# Altium integrated library ATK-DLAM62LB V1.0.IntLib: 194 symbols (continued)
## KEY_3
designator USER?, comment USER
按键; BOM名称: 3x6轻触开关; 版权归属: 正点原子; 学习资源: www.openedv.com
footprint TSW DIP-6*6*5 (6*6*5mm)
footprint TSW SMD-2S
footprint TSW SMD-3*6*2.5 (3*6*2.5mm)
footprint TSW SMD-3*6*4.3 (3*6*4.3mm)
footprint TSW SMD-3*6*5 (3*6*5mm)
footprint KEY_SOP324225 (KEY,3.2mm*4.2mm*2.5mm)
pins: 1, 2

## KF2EDGR-3.81-8P
designator J?
接线端子,8脚,间距3.81mm
footprint KF2EDGR_3.81_8P
pins: 1, 2, 3, 4, 5, 6, 7, 8

## L
designator L?, comment 4.7uH
小功率贴片电感磁珠; 版权归属: 源创客; BOM名称: 小功率贴片电感; 学习资源: www.ooocke.com
footprint L 0402 (小功率贴片电感)
footprint L 0603 (小功率贴片电感)
footprint L 0805 (小功率贴片电感)
footprint L 1206 (小功率贴片电感)
footprint L 1210 (小功率贴片电感)
footprint L 1806 (小功率贴片电感)
footprint L 1812 (小功率贴片电感)
footprint L 1008 (2.5mm*2.0mm*1.2mm(长*宽*高）)
footprint L_2520
pins: 1, 2

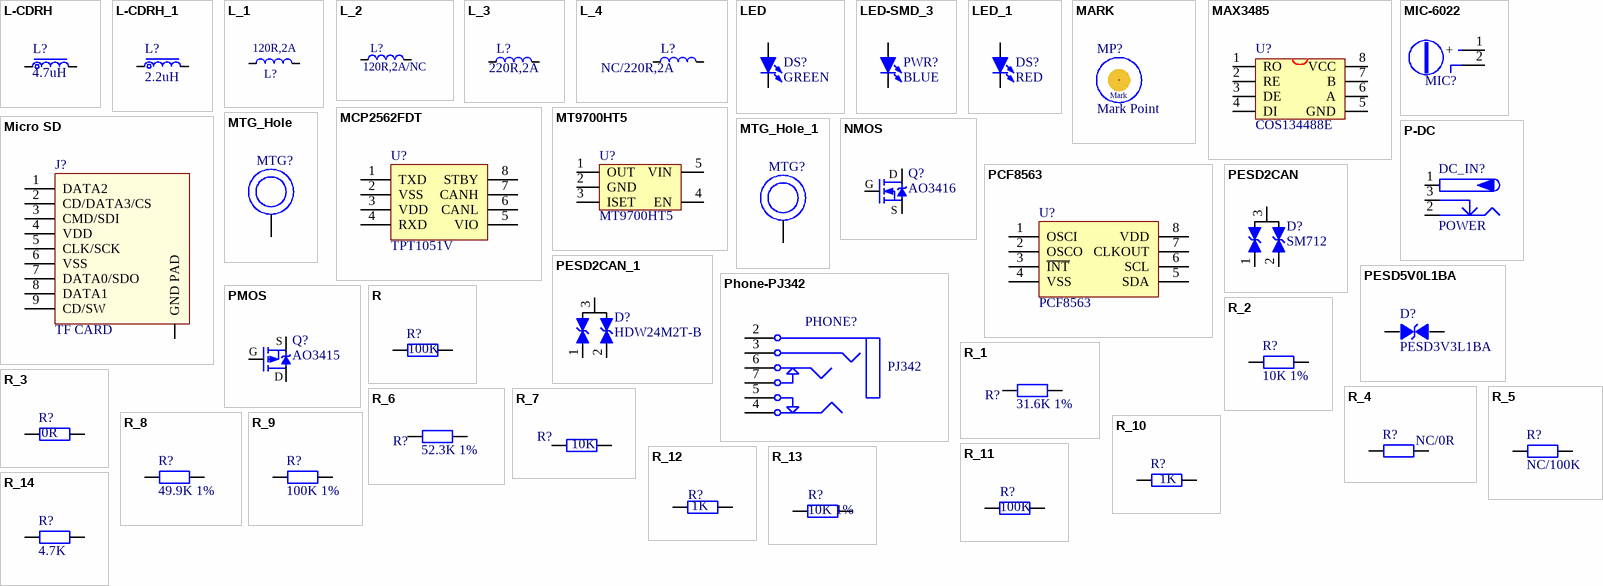
[diagram p2: symbols L-CDRH to R_14]

## L-CDRH
designator L?, comment 4.7uH
功率屏蔽电感; 版权归属: 正点原子; Parameter: 电感/磁珠; BOM名称: 功率屏蔽电感; 学习资源: www.openedv.com
footprint CDRH73 (7.3*7.3*3.4mm（长宽高）)
footprint CDRH74 (7.3*7.3*4.5mm（长宽高）)
footprint CDRH124 (12*12*4.5mm（长宽高）)
footprint CDRH125 (12*12*5mm（长宽高）)
footprint CDRH127 (12*12*8mm（长宽高）)
footprint CDRH129 (12*12*9.5mm（长宽高）)
footprint L-SMD-0420 (一体化成型电感 4*4.5*2mm（长宽高）)
footprint L-SMD-0630 (一体化成型电感)
footprint L-2520 (贴片电感-2520)
pins: 1, 2

## L-CDRH_1
designator L?, comment 2.2uH
功率屏蔽电感; 版权归属: 正点原子; Parameter: 电感/磁珠; BOM名称: 功率屏蔽电感; 学习资源: www.openedv.com
footprint CDRH73 (7.3*7.3*3.4mm（长宽高）)
footprint CDRH74 (7.3*7.3*4.5mm（长宽高）)
footprint CDRH124 (12*12*4.5mm（长宽高）)
footprint CDRH125 (12*12*5mm（长宽高）)
footprint CDRH127 (12*12*8mm（长宽高）)
footprint CDRH129 (12*12*9.5mm（长宽高）)
footprint L-SMD-0420 (一体化成型电感 4*4.5*2mm（长宽高）)
footprint L-SMD-0630 (一体化成型电感)
footprint L-2520 (贴片电感-2520)
pins: 1, 2

## L_1
designator L?, comment 120R,2A
小功率贴片电感磁珠; 版权归属: 源创客; BOM名称: 小功率贴片电感; 学习资源: www.ooocke.com
footprint L 0402 (小功率贴片电感)
footprint L 0603 (小功率贴片电感)
footprint L 0805 (小功率贴片电感)
footprint L 1206 (小功率贴片电感)
footprint L 1210 (小功率贴片电感)
footprint L 1806 (小功率贴片电感)
footprint L 1812 (小功率贴片电感)
footprint L 1008 (2.5mm*2.0mm*1.2mm(长*宽*高）)
footprint L_2520
pins: 1, 2

## L_2
designator L?, comment 120R,2A/NC
小功率贴片电感磁珠; 版权归属: 源创客; BOM名称: 小功率贴片电感; 学习资源: www.ooocke.com
footprint L 0402 (小功率贴片电感)
footprint L 0603 (小功率贴片电感)
footprint L 0805 (小功率贴片电感)
footprint L 1206 (小功率贴片电感)
footprint L 1210 (小功率贴片电感)
footprint L 1806 (小功率贴片电感)
footprint L 1812 (小功率贴片电感)
footprint L 1008 (2.5mm*2.0mm*1.2mm(长*宽*高）)
footprint L_2520
pins: 1, 2

## L_3
designator L?, comment 220R,2A
小功率贴片电感磁珠; 版权归属: 正点原子; BOM名称: 小功率贴片电感; 学习资源: www.openedv.com
footprint L 0402 (小功率贴片电感)
footprint L 0603 (小功率贴片电感)
footprint L 0805 (小功率贴片电感)
footprint L 1206 (小功率贴片电感)
footprint L 1210 (小功率贴片电感)
footprint L 1806 (小功率贴片电感)
footprint L 1812 (小功率贴片电感)
footprint L 1008 (2.5mm*2.0mm*1.2mm(长*宽*高）)
pins: 1, 2

## L_4
designator L?, comment NC/220R,2A
小功率贴片电感磁珠; 版权归属: 正点原子; BOM名称: 小功率贴片电感; 学习资源: www.openedv.com
footprint L 0402 (小功率贴片电感)
footprint L 0603 (小功率贴片电感)
footprint L 0805 (小功率贴片电感)
footprint L 1206 (小功率贴片电感)
footprint L 1210 (小功率贴片电感)
footprint L 1806 (小功率贴片电感)
footprint L 1812 (小功率贴片电感)
footprint L 1008 (2.5mm*2.0mm*1.2mm(长*宽*高）)
pins: 1, 2

## LED
designator DS?, comment GREEN
LED; BOM名称: 插件LED; 版权归属: 正点原子; Parameter: 发光二极管; 学习资源: www.openedv.com
footprint LED 0805 Green (绿色0805LED)
footprint LED 0805 Red (红色0805LED)
footprint LED 0805 Yellow (黄色0805LED)
footprint LED 0805 Blue (蓝色0805LED)
pins: 1 A, 2 K

## LED-SMD_3
designator PWR?, comment BLUE
贴片LED; 版权归属: 源创客; BOM名称: 贴片LED; 学习资源: www.ooocke.com
footprint LED 0603W (白色0603LED)
footprint LED 0603R (红色0603LED)
footprint LED 0603B (蓝色0603LED)
footprint LED 0603G (绿色0603LED)
footprint LED 0603Y (黄色0603LED)
footprint LED 0805G (绿色0805LED)
footprint LED 0805R (红色0805LED)
footprint LED 0805B
footprint LED 0805Y (黄色0805LED)
footprint LED 3528 (白色3528LED)
footprint LED 1206G (绿色1206LED)
footprint LED 5730-V (紫色5730LED)
footprint LED 1206Y (黄色1206LED)
footprint LED 0805W (白色0805LED)
footprint LED 1206B (蓝色1206LED)
footprint LED 1206W (白色1206LED)
footprint LED 1206R (红色1206LED)
pins: 1 A, 2 K

## LED_1
designator DS?, comment RED
LED; BOM名称: 插件LED; 版权归属: 正点原子; Parameter: 发光二极管; 学习资源: www.openedv.com
footprint LED 0805 Green (绿色0805LED)
footprint LED 0805 Red
footprint LED 0805 Yellow (黄色0805LED)
footprint LED 0805 Blue (蓝色0805LED)
pins: 1 A, 2 K

## MARK
designator MP?, comment Mark Point
footprint MTG_HOLE_M3 (M3l螺丝孔)
footprint MARK POINT (Footprint not found)
pins: 1
text: Mark

## MAX3485
designator U?, comment COS134488E
footprint SOP8_L (5*6*1.8mm（长宽高）)
footprint SOP8_N (5*6*1.8mm（长宽高）)
pins: 1 RO, 2 RE, 3 DE, 4 DI, 5 GND, 6 A, 7 B, 8 VCC

## MCP2562FDT
designator U?, comment TPT1051V
footprint SOP8_N (5*6*1.8mm（长宽高）)
pins: 1 TXD, 2 VSS, 3 VDD, 4 RXD, 5 VIO, 6 CANL, 7 CANH, 8 STBY

## MIC-6022
designator MIC?  (value not drawn)
MIC; 版权归属: 正点原子; Parameter: 接口器件; 学习资源: www.openedv.com
footprint MIC-6022
pins: 1 +, 2 GND

## Micro SD
designator J?, comment TF CARD
Micro SD卡; 版权归属: 正点原子; BOM名称: Micro SD卡; 学习资源: www.openedv.com
footprint Micro SD
pins: 0 GND PAD, 1 DATA2, 2 CD/DATA3/CS, 3 CMD/SDI, 4 VDD, 5 CLK/SCK, 6 VSS, 7 DATA0/SDO, 8 DATA1, 9 CD/SW

## MT9700HT5
designator U?
功率开关(5.5V-2A); BOM名称: 稳压芯片; 版权归属: 正点原子; Parameter: 芯片; 学习资源: www.openedv.com
footprint SOT23-5N (3x1.6x1.1mm(长宽高))
pins: 1 OUT, 2 GND, 3 ISET, 4 EN, 5 VIN

## MTG_Hole
designator MTG?, comment 螺母(M2,贴片螺母柱,铜镀镍,M2x4x1.5+2.9x1.0)  (value not drawn)
301020006
footprint MTG_HOLE_M3 (M3l螺丝孔)
footprint M2螺丝贴片螺母-直径4mm-高1.5mm (M3l螺丝孔)
pins: 1

## MTG_Hole_1
designator MTG?, comment 螺母(M3*6,贴片螺母柱,白色,SMTSO-M3-6ET)  (value not drawn)
301020001
footprint MTG_HOLE_M3 (M3l螺丝孔)
footprint M3*23+6
pins: 1

## NMOS
designator Q?, comment AO3416
NMOS; BOM名称: N沟道场效应管; 版权归属: 正点原子; Parameter: MOS管; 学习资源: www.openedv.com
footprint SOT23-3N (3x1.3x1mm(长宽高))
footprint SOT23-3L (3x1.3x1mm(长宽高))
footprint SOT23-3M (3x1.3x1mm(长宽高))
pins: 1 G, 2 S, 3 D

## P-DC
designator DC_IN?, comment POWER
低压电源接口; BOM名称: DC电源接口; 版权归属: 正点原子; 学习资源: www.openedv.com
footprint DC-012 (5.5*2.1)
footprint DC-005 (5.5*2.1mm，DC30V,2.5A)
footprint DC-002 (3.5*1.1mm,)
footprint DC-003 (3.5*1.1mm)
footprint DC-003A (3.5*1.1mm)
footprint DC-050 (5.5*2.1)
footprint DC10B
pins: 1 (power), 2 (power), 3 (power)

## PCF8563
designator U?
footprint TSSOP8 (TSOP, 8-Leads, Body 3.00x3.00mm, Pitch 0.65mm, IPC Medium Density)
footprint SOP8_N (5*6*1.8mm（长宽高）)
pins: 1 OSCI, 2 OSCO, 3 ~{INT}, 4 VSS, 5 SDA, 6 SCL, 7 CLKOUT, 8 VDD

## PESD2CAN
designator D?, comment SM712
ESD
footprint SOT23-3L (3x1.3x1mm(长宽高))
pins: 1, 2, 3

## PESD2CAN_1
designator D?, comment HDW24M2T-B
ESD
footprint SOT23-3L (3x1.3x1mm(长宽高))
pins: 1, 2, 3

## PESD5V0L1BA
designator D?, comment PESD3V3L1BA
ESD-静电保护TVS管
footprint SOD-123
footprint SOD-323 (1.8x1.3X0.9mm（长宽高，不包括引脚）)
footprint SOD-523 (二极管)
footprint SMA (二极管 SMA)
footprint SMB (二极管 SMB)
pins: 1, 2

## Phone-PJ342
designator PHONE?, comment PJ342
3.5耳机插座,带检测和麦克风; BOM名称: 耳机插座; 版权归属: 正点原子; Parameter: 接口器件; 学习资源: www.openedv.com
footprint PJ342A
pins: 2, 3, 4, 5, 6, 7

## PMOS
designator Q?, comment AO3415
PMOS; BOM名称: P沟道场效应管; 版权归属: 正点原子; Parameter: MOS管; 学习资源: www.openedv.com
footprint SOT23-3N (3x1.3x1mm(长宽高))
footprint SOT23-3L (3x1.3x1mm(长宽高))
footprint SOT23-3M (3x1.3x1mm(长宽高))
pins: 1 G, 2 S, 3 D

## R
designator R?, comment 100K
电阻; BOM名称: 贴片电阻; 版权归属: 正点原子; 学习资源: www.openedv.com; Parameter: 电阻
footprint R 0603 (1/10W贴片电阻)
pins: 1, 2

## R_1
designator R?, comment 31.6K 1%
电阻; BOM名称: 贴片电阻; 版权归属: 正点原子; 学习资源: www.openedv.com; Parameter: 电阻
footprint R 0603 (1/10W贴片电阻)
pins: 1, 2

## R_2
designator R?, comment 10K 1%
电阻; BOM名称: 贴片电阻; 版权归属: 正点原子; 学习资源: www.openedv.com; Parameter: 电阻
footprint R 0603 (1/10W贴片电阻)
pins: 1, 2

## R_3
designator R?, comment 0R
电阻; BOM名称: 贴片电阻; 版权归属: 正点原子; 学习资源: www.openedv.com; Parameter: 电阻
footprint R 0603 (1/10W贴片电阻)
pins: 1, 2

## R_4
designator R?, comment NC/0R
电阻; BOM名称: 贴片电阻; 版权归属: 正点原子; 学习资源: www.openedv.com; Parameter: 电阻
footprint R 0603 (1/10W贴片电阻)
pins: 1, 2

## R_5
designator R?, comment NC/100K
电阻; BOM名称: 贴片电阻; 版权归属: 正点原子; 学习资源: www.openedv.com; Parameter: 电阻
footprint R 0603 (1/10W贴片电阻)
pins: 1, 2

## R_6
designator R?, comment 52.3K 1%
电阻; BOM名称: 贴片电阻; 版权归属: 正点原子; 学习资源: www.openedv.com; Parameter: 电阻
footprint R 0603 (1/10W贴片电阻)
pins: 1, 2

## R_7
designator R?, comment 10K
电阻; BOM名称: 贴片电阻; 版权归属: 正点原子; 学习资源: www.openedv.com; Parameter: 电阻
footprint R 0603 (1/10W贴片电阻)
pins: 1, 2

## R_8
designator R?, comment 49.9K 1%
电阻; BOM名称: 贴片电阻; 版权归属: 正点原子; 学习资源: www.openedv.com; Parameter: 电阻
footprint R 0603 (1/10W贴片电阻)
pins: 1, 2

## R_9
designator R?, comment 100K 1%
电阻; BOM名称: 贴片电阻; 版权归属: 正点原子; 学习资源: www.openedv.com; Parameter: 电阻
footprint R 0603 (1/10W贴片电阻)
pins: 1, 2

## R_10
designator R?, comment 1K
电阻; BOM名称: 贴片电阻; 版权归属: 正点原子; 学习资源: www.openedv.com; Parameter: 电阻
footprint R 0603 (1/10W贴片电阻)
pins: 1, 2

## R_11
designator R?, comment 100K
贴片电阻; BOM名称: 电阻; 版权归属: 正点原子; 学习资源: www.openedv.com
footprint R 0603 (1/10W贴片电阻)
pins: 1, 2

## R_12
designator R?, comment 1K
贴片电阻; BOM名称: 电阻; 版权归属: 正点原子; 学习资源: www.openedv.com
footprint R 0603 (1/10W贴片电阻)
pins: 1, 2

## R_13
designator R?, comment 10K 1%
贴片电阻; BOM名称: 电阻; 版权归属: 正点原子; 学习资源: www.openedv.com
footprint R 0603 (1/10W贴片电阻)
pins: 1, 2

## R_14
designator R?, comment 4.7K
电阻; BOM名称: 贴片电阻; 版权归属: 正点原子; 学习资源: www.openedv.com; Parameter: 电阻
footprint R 0603 (1/10W贴片电阻)
pins: 1, 2

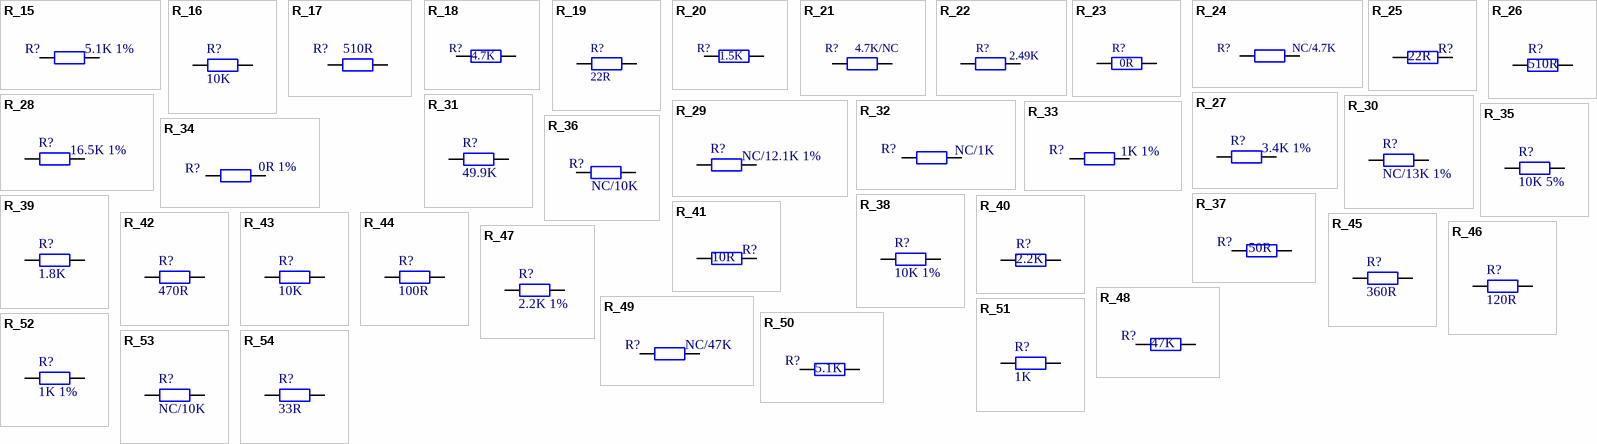
[diagram p3: symbols R_15 to R_54]

## R_15
designator R?, comment 5.1K 1%
电阻; BOM名称: 贴片电阻; 版权归属: 正点原子; 学习资源: www.openedv.com; Parameter: 电阻
footprint R 0603 (1/10W贴片电阻)
pins: 1, 2

## R_16
designator R?, comment 10K
贴片电阻; 版权归属: 正点原子; BOM名称: 贴片电阻; 学习资源: www.openedv.com
footprint R 0603 (1/10W贴片电阻)
pins: 1, 2

## R_17
designator R?, comment 510R
贴片电阻; 版权归属: 正点原子; BOM名称: 贴片电阻; 学习资源: www.openedv.com
footprint R 0603 (1/10W贴片电阻)
pins: 1, 2

## R_18
designator R?, comment 4.7K
贴片电阻; 版权归属: 源创客; BOM名称: 贴片电阻; 学习资源: www.ooocke.com
footprint R 0402 (1/16W贴片电阻)
pins: 1, 2

## R_19
designator R?, comment 22R
贴片电阻; 版权归属: 源创客; BOM名称: 贴片电阻; 学习资源: www.ooocke.com
footprint R 0402 (1/16W贴片电阻)
pins: 1, 2

## R_20
designator R?, comment 1.5K
贴片电阻; 版权归属: 源创客; BOM名称: 贴片电阻; 学习资源: www.ooocke.com
footprint R 0402 (1/16W贴片电阻)
pins: 1, 2

## R_21
designator R?, comment 4.7K/NC
贴片电阻; 版权归属: 源创客; BOM名称: 贴片电阻; 学习资源: www.ooocke.com
footprint R 0402 (1/16W贴片电阻)
pins: 1, 2

## R_22
designator R?, comment 2.49K
贴片电阻; 版权归属: 源创客; BOM名称: 贴片电阻; 学习资源: www.ooocke.com
footprint R 0402 (1/16W贴片电阻)
pins: 1, 2

## R_23
designator R?, comment 0R
贴片电阻; 版权归属: 源创客; BOM名称: 贴片电阻; 学习资源: www.ooocke.com
footprint R 0402 (1/16W贴片电阻)
pins: 1, 2

## R_24
designator R?, comment NC/4.7K
贴片电阻; 版权归属: 源创客; BOM名称: 贴片电阻; 学习资源: www.ooocke.com
footprint R 0402 (1/16W贴片电阻)
pins: 1, 2

## R_25
designator R?, comment 22R
电阻; BOM名称: 贴片电阻; 版权归属: 正点原子; 学习资源: www.openedv.com; Parameter: 电阻
footprint R 0402 (1/16W贴片电阻)
pins: 1, 2

## R_26
designator R?, comment 510R
电阻; BOM名称: 贴片电阻; 版权归属: 正点原子; 学习资源: www.openedv.com; Parameter: 电阻
footprint R 0603 (1/10W贴片电阻)
pins: 1, 2

## R_27
designator R?, comment 3.4K 1%
电阻; BOM名称: 贴片电阻; 版权归属: 正点原子; 学习资源: www.openedv.com; Parameter: 电阻
footprint R 0402 (1/16W贴片电阻)
pins: 1, 2

## R_28
designator R?, comment 16.5K 1%
电阻; BOM名称: 贴片电阻; 版权归属: 正点原子; 学习资源: www.openedv.com; Parameter: 电阻
footprint R 0402 (1/16W贴片电阻)
pins: 1, 2

## R_29
designator R?, comment NC/12.1K 1%
电阻; BOM名称: 贴片电阻; 版权归属: 正点原子; 学习资源: www.openedv.com; Parameter: 电阻
footprint R 0603 (1/10W贴片电阻)
pins: 1, 2

## R_30
designator R?, comment NC/13K 1%
电阻; BOM名称: 贴片电阻; 版权归属: 正点原子; 学习资源: www.openedv.com; Parameter: 电阻
footprint R 0603 (1/10W贴片电阻)
pins: 1, 2

## R_31
designator R?, comment 49.9K
电阻; BOM名称: 贴片电阻; 版权归属: 正点原子; 学习资源: www.openedv.com; Parameter: 电阻
footprint R 0603 (1/10W贴片电阻)
pins: 1, 2

## R_32
designator R?, comment NC/1K
电阻; BOM名称: 贴片电阻; 版权归属: 正点原子; 学习资源: www.openedv.com; Parameter: 电阻
footprint R 0402 (1/16W贴片电阻)
pins: 1, 2

## R_33
designator R?, comment 1K 1%
电阻; BOM名称: 贴片电阻; 版权归属: 正点原子; 学习资源: www.openedv.com; Parameter: 电阻
footprint R 0402 (1/16W贴片电阻)
pins: 1, 2

## R_34
designator R?, comment 0R 1%
电阻; BOM名称: 贴片电阻; 版权归属: 正点原子; 学习资源: www.openedv.com; Parameter: 电阻
footprint R 0603 (1/10W贴片电阻)
pins: 1, 2

## R_35
designator R?, comment 10K 5%
电阻; BOM名称: 贴片电阻; 版权归属: 正点原子; 学习资源: www.openedv.com; Parameter: 电阻
footprint R 0603 (1/10W贴片电阻)
pins: 1, 2

## R_36
designator R?, comment NC/10K
电阻; BOM名称: 贴片电阻; 版权归属: 正点原子; 学习资源: www.openedv.com; Parameter: 电阻
footprint R 0402 (1/16W贴片电阻)
pins: 1, 2

## R_37
designator R?, comment 50R
电阻; BOM名称: 贴片电阻; 版权归属: 正点原子; 学习资源: www.openedv.com; Parameter: 电阻
footprint R 0402 (1/16W贴片电阻)
pins: 1, 2

## R_38
designator R?, comment 10K 1%
贴片电阻; 版权归属: 正点原子; BOM名称: 贴片电阻; 学习资源: www.openedv.com
footprint R 0603 (1/10W贴片电阻)
pins: 1, 2

## R_39
designator R?, comment 1.8K
贴片电阻; 版权归属: 正点原子; BOM名称: 贴片电阻; 学习资源: www.openedv.com
footprint R 0603 (1/10W贴片电阻)
pins: 1, 2

## R_40
designator R?, comment 2.2K
电阻; BOM名称: 贴片电阻; 版权归属: 正点原子; 学习资源: www.openedv.com; Parameter: 电阻
footprint R 0402 (1/16W贴片电阻)
pins: 1, 2

## R_41
designator R?, comment 10R
电阻; BOM名称: 贴片电阻; 版权归属: 正点原子; 学习资源: www.openedv.com; Parameter: 电阻
footprint R 0402 (1/16W贴片电阻)
pins: 1, 2

## R_42
designator R?, comment 470R
电阻; BOM名称: 贴片电阻; 版权归属: 正点原子; 学习资源: www.openedv.com; Parameter: 电阻
footprint R 0402 (1/16W贴片电阻)
pins: 1, 2

## R_43
designator R?, comment 10K
贴片电阻; BOM名称: 电阻; 版权归属: 正点原子; 学习资源: www.openedv.com
footprint R 0402 (1/16W贴片电阻)
footprint R 0603 (1/10W贴片电阻)
pins: 1, 2

## R_44
designator R?, comment 100R
贴片电阻; BOM名称: 电阻; 版权归属: 正点原子; 学习资源: www.openedv.com
footprint R 0402 (1/16W贴片电阻)
footprint R 0603 (1/10W贴片电阻)
pins: 1, 2

## R_45
designator R?, comment 360R
贴片电阻; 版权归属: 正点原子; BOM名称: 贴片电阻; 学习资源: www.openedv.com
footprint R 0201 (1/20W贴片电阻)
footprint R 0201-HP (1/20W高精度贴片电阻)
footprint R 0402 (1/16W贴片电阻)
footprint R 0402-HP (1/16W高精度贴片电阻)
footprint R 0603 (1/10W贴片电阻)
footprint R 0603-HP (1/10W高精度贴片电阻)
footprint R 0805 (1/8W贴片电阻)
footprint R 0805-HP (1/8W高精度贴片电阻)
footprint R 1206 (1/4W贴片电阻)
footprint R 1206-HP (1/4W高精度贴片电阻)
footprint R 1210 (1/3W贴片电阻)
footprint R 1210-HP (1/3W高精度贴片电阻)
footprint R 1812 (1/2W贴片电阻)
footprint R 1812-HP (1/2W高精度贴片电阻)
footprint R 2010 (3/4W贴片电阻)
footprint R 2010-HP (3/4W高精度贴片电阻)
footprint R 2512 (1W贴片电阻)
footprint R 2512-HP (1W高精度贴片电阻)
footprint R 2728-HP (4W高精度贴片电阻)
footprint LR 2725 (4W高精度贴片电阻)
pins: 1, 2

## R_46
designator R?, comment 120R
贴片电阻; 版权归属: 正点原子; BOM名称: 贴片电阻; 学习资源: www.openedv.com
footprint R 0201 (1/20W贴片电阻)
footprint R 0201-HP (1/20W高精度贴片电阻)
footprint R 0402 (1/16W贴片电阻)
footprint R 0402-HP (1/16W高精度贴片电阻)
footprint R 0603 (1/10W贴片电阻)
footprint R 0603-HP (1/10W高精度贴片电阻)
footprint R 0805 (1/8W贴片电阻)
footprint R 0805-HP (1/8W高精度贴片电阻)
footprint R 1206 (1/4W贴片电阻)
footprint R 1206-HP (1/4W高精度贴片电阻)
footprint R 1210 (1/3W贴片电阻)
footprint R 1210-HP (1/3W高精度贴片电阻)
footprint R 1812 (1/2W贴片电阻)
footprint R 1812-HP (1/2W高精度贴片电阻)
footprint R 2010 (3/4W贴片电阻)
footprint R 2010-HP (3/4W高精度贴片电阻)
footprint R 2512 (1W贴片电阻)
footprint R 2512-HP (1W高精度贴片电阻)
footprint R 2728-HP (4W高精度贴片电阻)
footprint LR 2725 (4W高精度贴片电阻)
pins: 1, 2

## R_47
designator R?, comment 2.2K 1%
电阻; BOM名称: 贴片电阻; 版权归属: 正点原子; 学习资源: www.openedv.com; Parameter: 电阻
footprint R 0402 (1/16W贴片电阻)
pins: 1, 2

## R_48
designator R?, comment 47K
贴片电阻; 版权归属: 正点原子; BOM名称: 贴片电阻; 学习资源: www.openedv.com
footprint R 0603 (1/10W贴片电阻)
pins: 1, 2

## R_49
designator R?, comment NC/47K
贴片电阻; 版权归属: 正点原子; BOM名称: 贴片电阻; 学习资源: www.openedv.com
footprint R 0603 (1/10W贴片电阻)
pins: 1, 2

## R_50
designator R?, comment 5.1K
电阻; BOM名称: 贴片电阻; 版权归属: 正点原子; 学习资源: www.openedv.com; Parameter: 电阻
footprint R 0603 (1/10W贴片电阻)
pins: 1, 2

## R_51
designator R?, comment 1K
贴片电阻; 版权归属: 正点原子; BOM名称: 贴片电阻; 学习资源: www.openedv.com
footprint R 0603 (1/10W贴片电阻)
pins: 1, 2

## R_52
designator R?, comment 1K 1%
贴片电阻; 版权归属: 正点原子; BOM名称: 贴片电阻; 学习资源: www.openedv.com
footprint R 0603 (1/10W贴片电阻)
pins: 1, 2

## R_53
designator R?, comment NC/10K
贴片电阻; 版权归属: 正点原子; BOM名称: 贴片电阻; 学习资源: www.openedv.com
footprint R 0603 (1/10W贴片电阻)
pins: 1, 2

## R_54
designator R?, comment 33R
贴片电阻; 版权归属: 正点原子; BOM名称: 贴片电阻; 学习资源: www.openedv.com
footprint R 0603 (1/10W贴片电阻)
pins: 1, 2

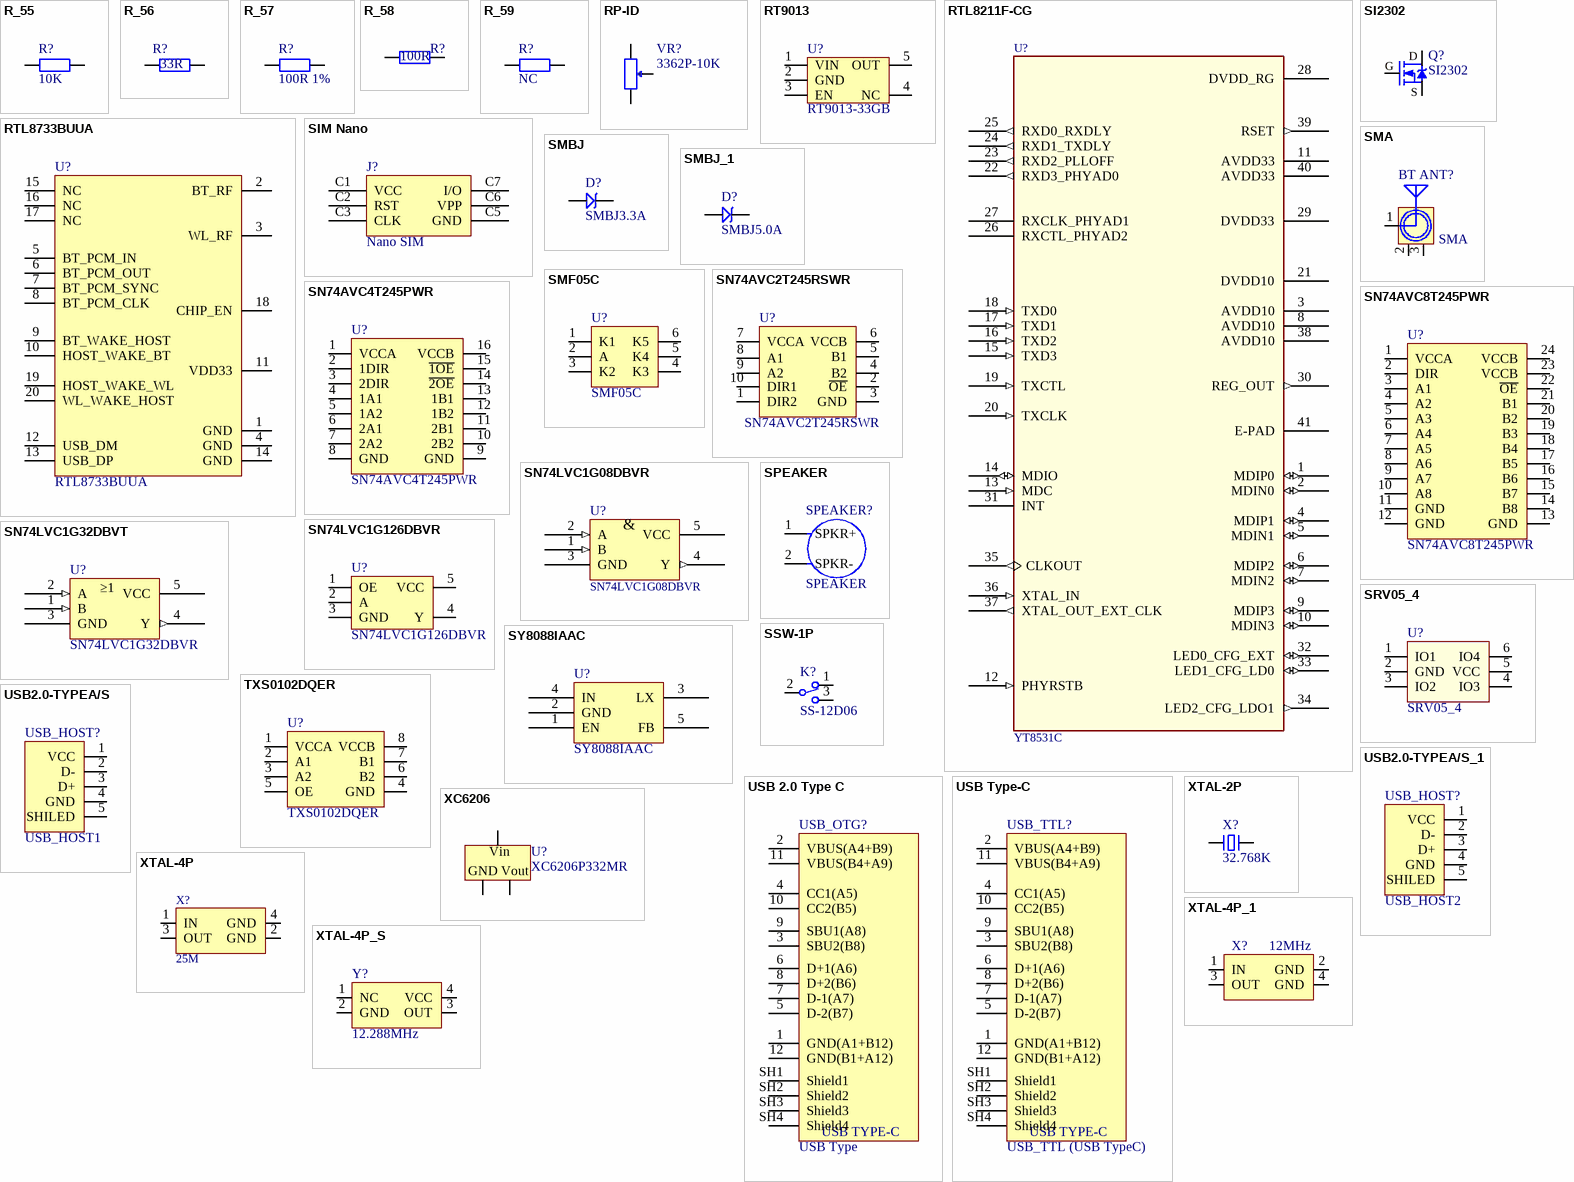
[diagram p4: symbols R_55 to XTAL-4P_S]

## R_55
designator R?, comment 10K
贴片电阻; 版权归属: 正点原子; BOM名称: 贴片电阻; 学习资源: www.openedv.com
footprint R 0603 (1/10W贴片电阻)
pins: 1, 2

## R_56
designator R?, comment 33R
电阻; BOM名称: 贴片电阻; 版权归属: 正点原子; 学习资源: www.openedv.com; Parameter: 电阻
footprint R 0603 (1/10W贴片电阻)
pins: 1, 2

## R_57
designator R?, comment 100R 1%
电阻; BOM名称: 贴片电阻; 版权归属: 正点原子; 学习资源: www.openedv.com; Parameter: 电阻
footprint R 0603 (1/10W贴片电阻)
pins: 1, 2

## R_58
designator R?, comment 100R
电阻; BOM名称: 贴片电阻; 版权归属: 正点原子; 学习资源: www.openedv.com; Parameter: 电阻
footprint R 0603 (1/10W贴片电阻)
pins: 1, 2

## R_59
designator R?, comment NC
电阻; BOM名称: 贴片电阻; 版权归属: 正点原子; 学习资源: www.openedv.com; Parameter: 电阻
footprint R 0603 (1/10W贴片电阻)
pins: 1, 2

## RP-ID
designator VR?, comment 3362P-10K
插件单联电位器; BOM名称: 插件电位器; 版权归属: 正点原子; 学习资源: www.openedv.com
footprint 3296W (Precise Multi-Winding Adjustable Resistor)
footprint 3306W
footprint 3319P
footprint 3362P
footprint 3386W
footprint RM065 (蓝白可调电位器)
footprint WH148-1-G15 (单联电位器，脚距：5mm，柄长：15mm)
footprint WH148-1-G18 (单联电位器，脚距：5mm，柄长：18mm)
footprint WH148-1-G20 (单联电位器，脚距：5mm，柄长：20mm)
footprint WH148-1-G25 (单联电位器，脚距：5mm，柄长：25mm)
footprint 3266W (长：7mm，宽：4.8mm，高：7.5mm)
footprint 3266X (长：7mm，宽：4.8mm，高：7.5mm)
footprint 3266Y (长：7mm，宽：4.8mm，高：7.5mm)
footprint 3266Z (长：7mm，宽：4.8mm，高：7.5mm)
footprint XV09223NPV-20F (长9.85mm，宽11.55mm，高20mm)
footprint XV09223NPV-25F (长9.85mm，宽11.55mm，高25mm)
footprint XV09223NPV-30F (长9.85mm，宽11.55mm，高30mm)
footprint 3006P (19.05mm*4.83mm*6.35mm(长*宽*高）)
pins: 1, 2, 3

## RT9013
designator U?, comment RT9013-33GB
LDO 5.5V 500mA; BOM名称: 稳压芯片; 版权归属: 正点原子; Parameter: 芯片; 学习资源: www.openedv.com
footprint SOT23-5L (3x1.6x1.1mm(长宽高))
footprint SOT23-5N
footprint SOT23-5M (3x1.6x1.1mm(长宽高))
pins: 1 VIN, 2 GND, 3 EN, 4 NC, 5 OUT

## RTL8211F-CG
designator U?, comment YT8531C
footprint QFN40 (QFN, 40-Leads, Body 5.00x5.00mm, Pitch 0.40mm, Thermal Pad 3.70x3.70mm, IPC Low Density)
pins: 1 MDIP0 (io), 2 MDIN0 (io), 3 AVDD10 (power), 4 MDIP1 (io), 5 MDIN1 (io), 6 MDIP2 (io), 7 MDIN2 (io), 8 AVDD10 (power), 9 MDIP3 (io), 10 MDIN3 (io), 11 AVDD33 (power), 12 PHYRSTB (in), 13 MDC (in), 14 MDIO (io), 15 TXD3 (in), 16 TXD2 (in), 17 TXD1 (in), 18 TXD0 (in), 19 TXCTL (in), 20 TXCLK (in), 21 DVDD10 (power), 22 RXD3_PHYAD0 (out), 23 RXD2_PLLOFF (out), 24 RXD1_TXDLY (out), 25 RXD0_RXDLY (out), 26 RXCTL_PHYAD2, 27 RXCLK_PHYAD1, 28 DVDD_RG (power), 29 DVDD33 (power), 30 REG_OUT (out), 31 INT, 32 LED0_CFG_EXT (io), 33 LED1_CFG_LD0 (io), 34 LED2_CFG_LDO1 (out), 35 CLKOUT (out), 36 XTAL_IN (in), 37 XTAL_OUT_EXT_CLK (out), 38 AVDD10 (power), 39 RSET (out), 40 AVDD33 (power), 41 E-PAD (power)

## RTL8733BUUA
designator U?
footprint Model Name (Footprint not found)
footprint RTL8733BUBUA (RTL8733BUBUA WIFI&BT模组)
pins: 1 GND, 2 BT_RF, 3 WL_RF, 4 GND, 5 BT_PCM_IN, 6 BT_PCM_OUT, 7 BT_PCM_SYNC, 8 BT_PCM_CLK, 9 BT_WAKE_HOST, 10 HOST_WAKE_BT, 11 VDD33, 12 USB_DM, 13 USB_DP, 14 GND, 15 NC, 16 NC, 17 NC, 18 CHIP_EN, 19 HOST_WAKE_WL, 20 WL_WAKE_HOST

## SI2302
designator Q?
NMOS 20V-+3.0A 55mΩ; BOM名称: N沟道场效应管; 版权归属: 正点原子; Parameter: MOS管; 学习资源: www.openedv.com
footprint SOT23-3N
pins: 1 G, 2 S, 3 D

## SIM Nano
designator J?, comment Nano SIM
Nano SIM卡座; 版权归属: 正点原子; Parameter: 接口器件; 学习资源: www.openedv.com
footprint Nano SIM 7P (7P弹出式Nano SIM卡座)
pins: C1 VCC, C2 RST, C3 CLK, C4 NC hidden, C5 GND, C6 VPP, C7 I/O

## SMA
designator BT ANT?
SMA-2.4G射频天线接口; 版权归属: 正点原子; BOM名称: SMA-2.4G射频天线接口; 学习资源: www.openedv.com
footprint SMA-KWE (SMA 90度射频座)
pins: 1 ANT, 2 GND, 3 GND

## SMBJ
designator D?, comment SMBJ3.3A
TVS
footprint SMBJ
pins: 1, 2

## SMBJ_1
designator D?, comment SMBJ5.0A
TVS
footprint SMBJ
pins: 1, 2

## SMF05C
designator U?
footprint SOT363-6L (2.0x2.1x1.1mm(长宽高))
pins: 1 K1, 2 A, 3 K2, 4 K3, 5 K4, 6 K5

## SN74AVC2T245RSWR
designator U?
转换器/电平转换器; 版权归属: 正点原子; Parameter: 芯片; 学习资源: www.openedv.com
footprint WQFN-10_L1.8-W1.4-P0.40-BL
pins: 1 DIR2, 2 ~{OE}, 3 GND, 4 B2, 5 B1, 6 VCCB, 7 VCCA, 8 A1, 9 A2, 10 DIR1

## SN74AVC4T245PWR
designator U?
缓冲器/收发器
footprint TSSOP-16_L5.0-W4.4-P0.65-LS6.4-BL
pins: 1 VCCA, 2 1DIR, 3 2DIR, 4 1A1, 5 1A2, 6 2A1, 7 2A2, 8 GND, 9 GND, 10 2B2, 11 2B1, 12 1B2, 13 1B1, 14 ~{2OE}, 15 ~{1OE}, 16 VCCB

## SN74AVC8T245PWR
designator U?
8位缓冲器
footprint TSSOP-24_L7.8-W4.4-P0.65-LS6.4-BL
pins: 1 VCCA, 2 DIR, 3 A1, 4 A2, 5 A3, 6 A4, 7 A5, 8 A6, 9 A7, 10 A8, 11 GND, 12 GND, 13 GND, 14 B8, 15 B7, 16 B6, 17 B5, 18 B4, 19 B3, 20 B2, 21 B1, 22 ~{OE}, 23 VCCB, 24 VCCB

## SN74LVC1G08DBVR
designator U?
IC SINGLE 2-INPUT POSITIVE-AND GATE X2SON5; Mistral Part No: 141020100009-R; Manufacturer: TEXAS INSTRUMENTS; Mfr_part_number: SN74LVC1G08DPWR; Part_type: ICS\DIGITAL\GATES; Project: AM64X_SKEVM; Tolerance: NA; Customs_HS_Code: 85423100; Custom_Duty: 15%; MECHANICAL 3D STEP FILE: X2SON5_TLV7021_30X30_0-4; Footprint Ref: X2SON5_TLV7021_30X30_0-4; Voltage: NA; Wattage: NA; Package: X2SON5; Distributor_name: DIGIKEY; Distributor_part_number: 296-40549-1-ND; Library Ref: 74AHC1G08GW_SOT353-5; Height: 0.40MM; Weight: 0.6mg; Temperature: -40癈+125癈; Datasheet: Y:\MIS_DATABASE\DATASHEETS\ICS\DIGITAL\GATES\SN74LVC1G08XX.PDF; Crtd /date: ALVY/131020; Chkd/date: MANIRAJA/141020; RoHS: RoHS; Library Path: Y:\MIS_DATABASE\Library\ALTIUM_TOOL\SCHEMATICS_PARTS\MS_GATE_Library.schlib; Footprint Path: Y:\MIS_DATABASE\Library\ALTIUM_TOOL\PCB_FOOTPRINTS\Altium_Footprint_Lib.PcbLib
footprint SOT-23-5_L3.0-W1.7-P0.95-LS2.8-BR
footprint SOT23-5N (3x1.6x1.1mm(长宽高))
pins: 1 B (in), 2 A (in), 3 GND (power), 4 Y (out), 5 VCC (power)
text: &

## SN74LVC1G32DBVT
designator U?, comment SN74LVC1G32DBVR
footprint SOT-23-5_L3.0-W1.7-P0.95-LS2.8-BR
footprint SOT23-5N (3x1.6x1.1mm(长宽高))
pins: 1 B (in), 2 A (in), 3 GND (power), 4 Y (out), 5 VCC (power)
text: ≥1

## SN74LVC1G126DBVR
designator U?
1路 非反向三态缓冲器 高有效; 版权归属: 正点原子; Parameter: 芯片; 学习资源: www.openedv.com
footprint SOT23-5N
pins: 1 OE, 2 A, 3 GND, 4 Y, 5 VCC

## SPEAKER
designator SPEAKER?
喇叭2307
footprint SPEAKER (2307喇叭，8Ω，1W，23mm*7mm，2P)
pins: 1 SPKR+, 2 SPKR-

## SRV05_4
designator U?
ESD保护二极管阵列
footprint SOT23-6N (3x1.6x1.1mm(长宽高))
pins: 1 IO1, 2 GND, 3 IO2, 4 IO3, 5 VCC, 6 IO4

## SSW-1P
designator K?, comment SS-12D06
1路波动开关; BOM名称: 按键/开关; 版权归属: 正点原子; 学习资源: www.openedv.com
footprint SS-12F23
footprint SS-12D10
footprint MSK-12C01-07 (6.7*2.8*1.5mm(长宽高）)
footprint SS-12D06 (脚距3mm)
footprint SS-12F44 (脚距3mm)
pins: 1, 2, 3

## SY8088IAAC
designator U?
footprint SOT-23-5
pins: 1 EN, 2 GND, 3 LX, 4 IN, 5 FB

## TXS0102DQER
designator U?
转换器/电平转换器; 版权归属: 正点原子; Parameter: 芯片; 学习资源: www.openedv.com
footprint X2SON-8_L1.4-W1.0-P0.35-BL
pins: 1 VCCA, 2 A1, 3 A2, 4 GND, 5 OE, 6 B2, 7 B1, 8 VCCB

## USB2.0-TYPEA/S
designator USB_HOST?, comment USB_HOST1
USB-A型母接口; 版权归属: 正点原子; Parameter: 接口器件; BOM名称: USB-A型母接口; 学习资源: www.openedv.com
footprint USB 2.0_TEPE A AF90 (USB 2.0_TEPE A 型母头，侧插)
pins: 1 VCC, 2 D-, 3 D+, 4 GND, 5 SHILED

## USB2.0-TYPEA/S_1
designator USB_HOST?, comment USB_HOST2
USB-A型母接口; 版权归属: 正点原子; Parameter: 接口器件; BOM名称: USB-A型母接口; 学习资源: www.openedv.com
footprint USB 2.0_TEPE A AF90 (USB 2.0_TEPE A 型母头，侧插)
pins: 1 VCC, 2 D-, 3 D+, 4 GND, 5 SHILED

## USB 2.0 Type C
designator USB_OTG?, comment USB Type
12P TypeC 母座; 版权归属: 正点原子; Parameter: 接口器件; 学习资源: www.openedv.com
footprint USB2.0-TYPE-C-16P (USB Type-C 12P/16P 加固定焊盘)
pins: 1 GND(A1+B12), 2 VBUS(A4+B9), 3 SBU2(B8), 4 CC1(A5), 5 D-2(B7), 6 D+1(A6), 7 D-1(A7), 8 D+2(B6), 9 SBU1(A8), 10 CC2(B5), 11 VBUS(B4+A9), 12 GND(B1+A12), SH1 Shield1, SH2 Shield2, SH3 Shield3, SH4 Shield4
text: USB TYPE-C

## USB Type-C
designator USB_TTL?, comment USB_TTL (USB TypeC)
12P TypeC 母座
footprint USB Type-C (USB Type-C 12P/16P)
footprint USB TYPE-C - 10*9
footprint USB2.0-TYPE-C-16P
pins: 1 GND(A1+B12), 2 VBUS(A4+B9), 3 SBU2(B8), 4 CC1(A5), 5 D-2(B7), 6 D+1(A6), 7 D-1(A7), 8 D+2(B6), 9 SBU1(A8), 10 CC2(B5), 11 VBUS(B4+A9), 12 GND(B1+A12), SH1 Shield1, SH2 Shield2, SH3 Shield3, SH4 Shield4
text: USB TYPE-C

## XC6206
designator U?, comment XC6206P332MR
LDO 5.5V 200-300mA; 版权归属: 正点原子; Parameter: 芯片; Package: SOT-23; 学习资源: www.openedv.com
footprint SOT23-3L (3x1.3x1mm(长宽高))
footprint SOT23-3M (3x1.3x1mm(长宽高))
footprint SOT23-3N (3x1.3x1mm(长宽高))
pins: 1 GND, 2 Vout, 3 Vin

## XTAL-2P
designator X?, comment 32.768K
2脚无源晶振; BOM名称: 2脚晶振; 版权归属: 正点原子; 学习资源: www.openedv.com
footprint XTAL-3X10
footprint XTAL-3X8
footprint XTAL-2X6H
footprint XTAL-2X6
footprint XTAL-49S DIP
footprint XTAL-3215
footprint XTAL-3X8H
footprint XTAL-49S SMD
footprint XTAL-2X6H
pins: 1, 2

## XTAL-4P
designator X?, comment 25M
4脚无源晶振; BOM名称: 4脚晶振; 版权归属: 源创客; 学习资源: www.ooocke.com
footprint XTAL-5032
footprint XTAL-3225 (贴片晶振-3225)
footprint XTAL-7050 (7mm*5mm)
pins: 1 IN, 2 GND, 3 OUT, 4 GND

## XTAL-4P_1
designator X?, comment 12MHz
4脚无源晶振; BOM名称: 4脚晶振; 版权归属: 正点原子; Parameter: 晶振; 学习资源: www.openedv.com
footprint XTAL-5032
footprint XTAL-3225
footprint XTAL-7050 (7mm*5mm)
pins: 1 IN, 2 GND, 3 OUT, 4 GND

## XTAL-4P_S
designator Y?, comment 12.288MHz
4脚有源晶振; BOM名称: 4脚晶振; 版权归属: 正点原子; Parameter: 晶振; 学习资源: www.openedv.com
footprint XTAL-5032 - S (5032 有源晶振)
footprint XTAL-3225 - S (3225有源晶振)
footprint XTAL-7050 (7mm*5mm)
pins: 1 NC, 2 GND, 3 OUT, 4 VCC